# Altium footprint library Connector.PcbLib: 129 footprints (part 5 of 9)
Each footprint in its own frame and in the unit in brackets; x right, y up, seen from the top. Pads: shape width x height; smd on the part's side, far side on the other; paste and mask are expansions set on the pad; w line width, h text height; cw(c..) or ccw(c..) is an arc to the next point about the centre after c.
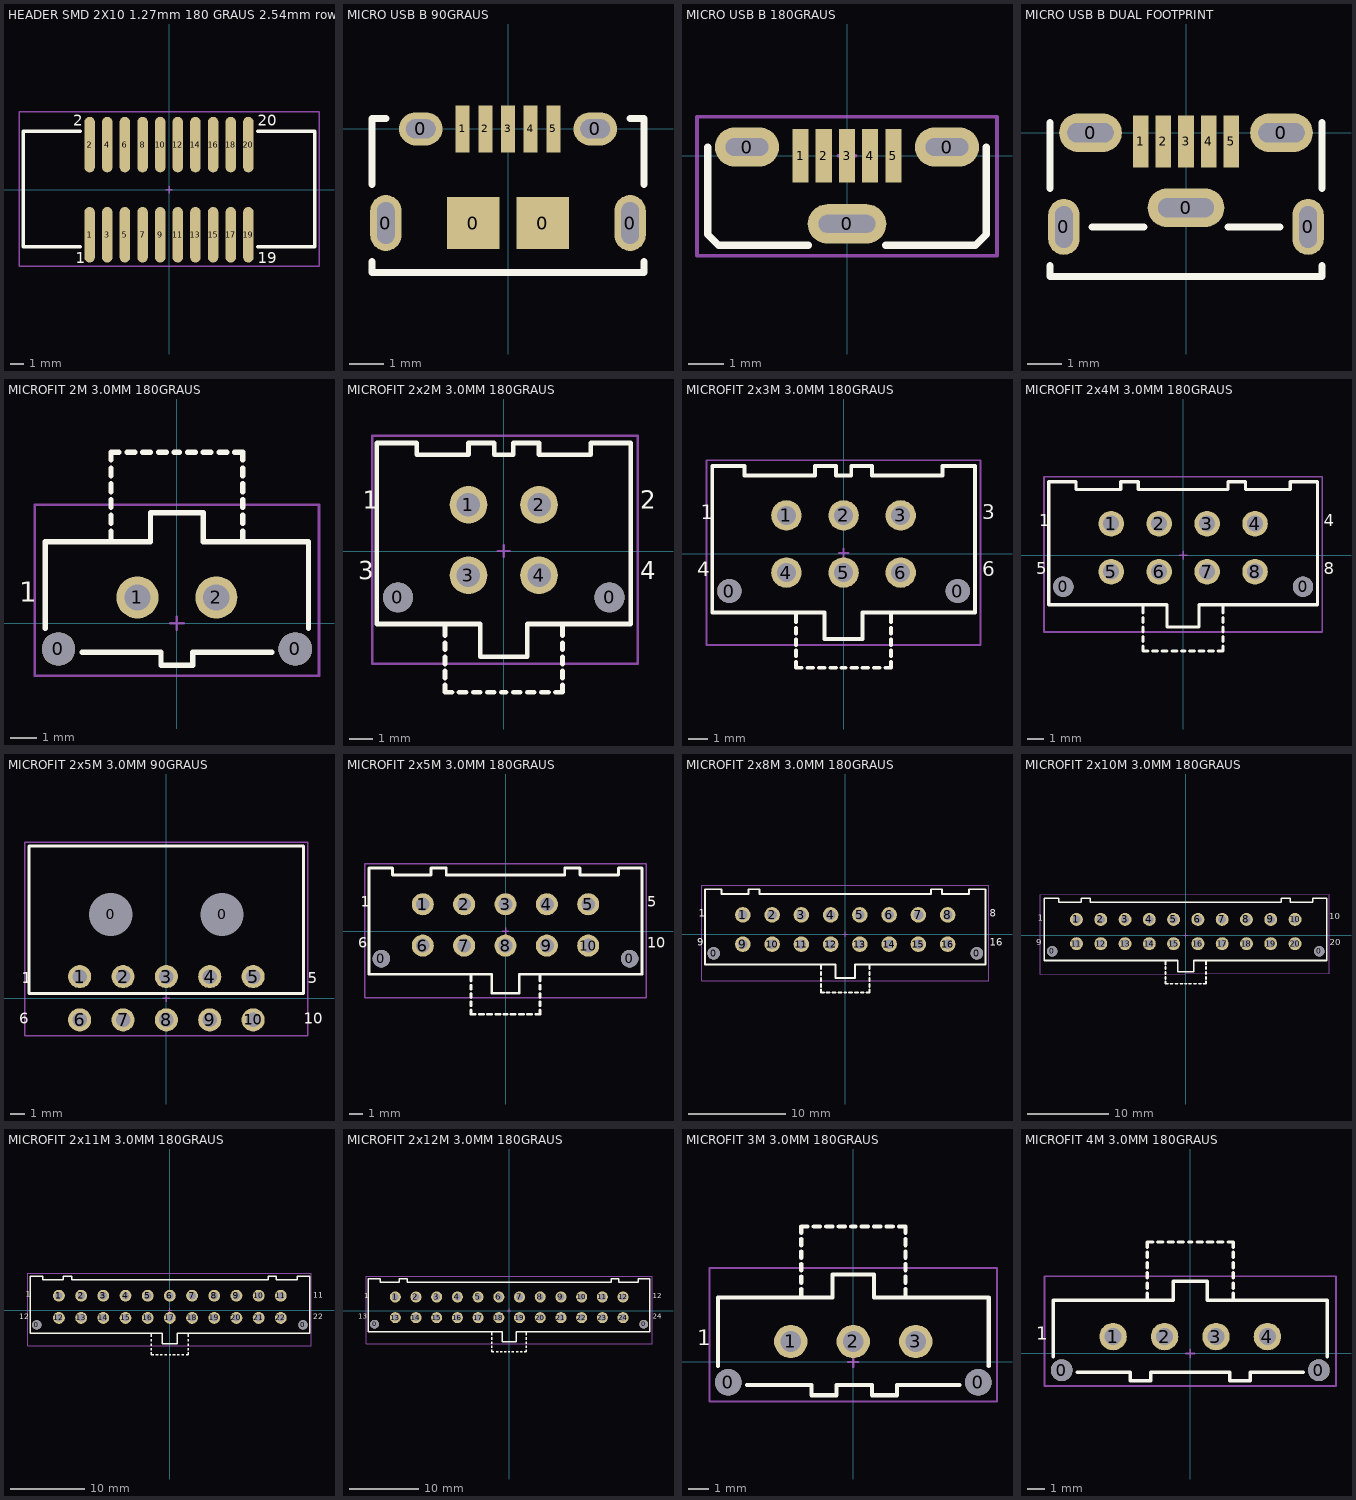
[diagram p4: the footprints below, top view; thin cyan lines are the x and y axes]

## HEADER SMD 2X10 1.27mm 180 GRAUS 2.54mm row spacing shrouded [mm]
height 6.5
pads (20):
  oval 0.76x4 smd: 1(-5.715,-3.25) 2(-5.715,3.25) 3(-4.445,-3.25) 4(-4.445,3.25) 5(-3.175,-3.25) 6(-3.175,3.25) 7(-1.905,-3.25) 8(-1.905,3.25) 9(-0.635,-3.25) 10(-0.635,3.25) 11(0.635,-3.25) 12(0.635,3.25) 13(1.905,-3.25) 14(1.905,3.25) 15(3.175,-3.25) 16(3.175,3.25) 17(4.445,-3.25) 18(4.445,3.25) 19(5.715,-3.25) 20(5.715,3.25)
Top Overlay:
  lines w0.254: -6.4,-4.1 -10.5,-4.1 -10.5,4.2 -6.4,4.2 ; 6.4,-4.1 10.5,-4.1 10.5,4.2 6.4,4.2
  text "20" at 6.4,4.6 h0.8
  text "19" at 6.4,-5.3 h0.8
  text "2" at -6.9,4.6 h0.8
  text "1" at -6.7,-5.3 h0.8
Mechanical 15:
  lines w0.1: -0.25,0 0.25,0 ; 0,-0.25 0,0.25 ; -10.8,-5.5 -10.8,5.6 10.8,5.6 10.8,-5.5 -10.8,-5.5
3D body "SBH41-_ _ _B-D10-SM-_ _.STEP": height 6.49, standoff -0.81, extent -10.365,-4.2 10.365,4.3

## MICRO USB B 90GRAUS [mm]
pads (11):
  oval 0.9x1.6 hole 0.5 slot 1.2 at 90 deg: 0(-3.5,-2.7) 0(3.5,-2.7)
  oval 1.25x0.95 hole 0.55 slot 0.85 at 0 deg: 0(-2.5,0) 0(2.5,0)
  rect 1.5x1.5 smd: 0(-1,-2.7) 0(1,-2.7)
  rect 0.4x1.35 smd: 1(-1.3,0) 2(-0.65,0) 3(0,0) 4(0.65,0) 5(1.3,0)
Top Overlay:
  lines w0.2: -3.9,-3.8 -3.9,-4.125 3.9,-4.125 3.9,-3.8 ; -3.9,-1.6 -3.9,0.3 -3.5,0.3 ; 3.5,0.3 3.9,0.3 3.9,-1.6
3D body "User Library-10118194.STEP": height 2.73, standoff -0.55, extent -4.025,-5.38 4.025,0.2

## MICRO USB B 180GRAUS [mm]
height 6.7
pads (8):
  oval 1.8x1.1 hole 0.5 slot 1.2 at 0 deg: 0(-2.8,0.25) 0(2.8,0.25)
  oval 2.2x1.1 hole 0.5 slot 1.6 at 0 deg: 0(0,-1.9)
  rect 0.45x1.5 smd: 1(-1.3,0) 2(-0.65,0) 3(0,0) 4(0.65,0) 5(1.3,0)
Top Overlay:
  lines w0.2: -3.9,0.25 -3.9,-2.2 -3.6,-2.5 -1.075,-2.5 ; 1.075,-2.5 3.6,-2.5 3.9,-2.2 3.9,0.25
Mechanical 15:
  lines w0.1: -0.25,0 0.25,0 ; 0,-0.25 0,0.25 ; -4.2,-2.8 -4.2,1.1 4.2,1.1 4.2,-2.8 -4.2,-2.8
3D body "Micro USB B 1051330011.STEP": height 6.65, standoff -2.36, extent -4.025,-2.41 3.975,0.605

## MICRO USB B DUAL FOOTPRINT [mm] "Micro USB 90 ou 180 graus"
pads (10):
  oval 0.9x1.6 hole 0.5 slot 1.2 at 90 deg: 0(-3.5,-2.7) 0(3.5,-2.7)
  oval 1.8x1.1 hole 0.55 slot 1.325 at 0 deg: 0(-2.738,0) 0(2.738,0)
  oval 2.2x1.1 hole 0.55 slot 1.6 at 0 deg: 0(0,-2.15)
  rect 0.45x1.5 smd: 1(-1.3,-0.25) 2(-0.65,-0.25) 3(0,-0.25) 4(0.65,-0.25) 5(1.3,-0.25)
Top Overlay:
  lines w0.2: -3.9,-3.8 -3.9,-4.125 3.9,-4.125 3.9,-3.8 ; -3.9,0 -3.9,-1.6 -3.9,0.3 ; -2.7,-2.7 -1.2,-2.7 ; 1.2,-2.7 2.7,-2.7 ; 3.9,0 3.9,-1.6 3.9,0.3
3D body "User Library-10118194.STEP": height 2.73, standoff -0.55, extent -4.025,-5.38 4.025,0.2
3D body "Micro USB B 1051330011.STEP": height 6.65, standoff -2.36, extent -4.025,-2.66 3.975,0.355

## MICROFIT 2M 3.0MM 180GRAUS [mm]
height 9.9
pads (4):
  round 1.27 hole 1.27 unplated: 0(-4.5,-0.98) 0(4.5,-0.98)
  round 1.6 hole 1: 1(-1.5,0.98) 2(1.5,0.98)
Top Overlay:
  lines w0.2: -5,-0.2 -5,3.1 -1,3.1 -1,4.2 1,4.2 1,3.1 5,3.1 5,-0.2 ; -3.6,-1.1 -0.6,-1.1 -0.6,-1.6 0.6,-1.6 0.6,-1.1 3.6,-1.1 ; -2.5,3.2 -2.5,3.5 ; -2.5,3.8 -2.5,4.1 ; -2.5,4.4 -2.5,4.7 ; -2.5,5 -2.5,5.3 ; -2.5,5.6 -2.5,5.9 ; -2.5,6.2 -2.5,6.5 -2.2,6.5 ; -1.9,6.5 -1.6,6.5 ; -1.3,6.5 -1,6.5 ; -0.7,6.5 -0.4,6.5 ; -0.1,6.5 0.1,6.5 ; 0.4,6.5 0.7,6.5 ; 1,6.5 1.3,6.5 ; 1.6,6.5 1.9,6.5 ; 2.2,6.5 2.5,6.5 2.5,6.2 ; 2.5,3.2 2.5,3.5 ; 2.5,3.8 2.5,4.1 ; 2.5,4.4 2.5,4.7 ; 2.5,5 2.5,5.3 ; 2.5,5.6 2.5,5.9
  text "1" at -6,0.81 h0.76
Mechanical 15:
  lines w0.1: -0.25,0 0.25,0 ; 0,-0.25 0,0.25 ; -5.4,-2 -5.4,4.5 5.4,4.5 5.4,-2 -5.4,-2
3D body "STEP-662002013322-rev1.stp": height 17.6, standoff 3.6, extent -4.14,-1.7 4.14,6.38
3D body "Microfit 2 vias.STEP": height 9.95, standoff -3.13, extent -4.825,-1.495 4.825,4.075

## MICROFIT 2x2M 3.0MM 180GRAUS [mm]
height 9.9
pads (6):
  round 1.27 hole 1.27 unplated: 0(-4.5,-1.97) 0(4.5,-1.97)
  round 1.6 hole 1: 1(-1.5,1.97) 2(1.5,1.97) 3(-1.5,-1.03) 4(1.5,-1.03)
Top Overlay:
  lines w0.2: -2.5,-5.7 -2.5,-6 -2.2,-6 ; -2.5,-5.4 -2.5,-5.1 ; -2.5,-4.8 -2.5,-4.5 ; -2.5,-4.2 -2.5,-3.9 ; -2.5,-3.6 -2.5,-3.1 ; -1.9,-6 -1.6,-6 ; -1.3,-6 -1,-6 ; -0.7,-6 -0.4,-6 ; -0.1,-6 0.1,-6 ; 0.4,-6 0.7,-6 ; 1,-6 1.3,-6 ; 1.6,-6 1.9,-6 ; 2.2,-6 2.5,-6 2.5,-5.7 ; 2.5,-5.4 2.5,-5.1 ; 2.5,-4.8 2.5,-4.5 ; 2.5,-4.2 2.5,-3.9 ; 2.5,-3.6 2.5,-3.1 ; -5.4,-3.1 -5.4,4.6 -3.7,4.6 -3.7,4.1 -1.5,4.1 -1.5,4.6 -0.8,4.6 -0.4,4.6 -0.4,4.1 0.4,4.1 0.4,4.6 0.8,4.6 1.5,4.6 1.5,4.1 3.7,4.1 3.7,4.6 5.4,4.6 5.4,-3.1 1,-3.1 1,-4.49 -1,-4.49 -1,-3.1 -5.4,-3.1
  text "1" at -6,1.8 h0.76
  text "2" at 5.8,1.8 h0.76
  text "3" at -6.2,-1.2 h0.76
  text "4" at 5.8,-1.2 h0.76
Mechanical 15:
  lines w0.1: -0.25,0 0.25,0 ; 0,-0.25 0,0.25 ; -5.6,-4.8 5.7,-4.8 5.7,4.9 -5.6,4.9 -5.6,-4.8
3D body "STEP-662004113322-rev1.stp": height 17.7, standoff 3.7, extent -3.425,-5.9 3.425,4.7
3D body "430450427.STEP": height 9.95, standoff -3.14, extent -5.075,-4.3 5.075,4.47

## MICROFIT 2x3M 3.0MM 180GRAUS [mm]
height 9.9
pads (8):
  round 1.27 hole 1.27 unplated: 0(-6,-1.97) 0(6,-1.97)
  round 1.6 hole 1: 1(-3,2) 2(0,2) 3(3,2) 4(-3,-1) 5(0,-1) 6(3,-1)
Top Overlay:
  lines w0.2: -2.5,-5.7 -2.5,-6 -2.2,-6 ; -2.5,-5.4 -2.5,-5.1 ; -2.5,-4.8 -2.5,-4.5 ; -2.5,-4.2 -2.5,-3.9 ; -2.5,-3.6 -2.5,-3.1 ; -1.9,-6 -1.6,-6 ; -1.3,-6 -1,-6 ; -0.7,-6 -0.4,-6 ; -0.1,-6 0.1,-6 ; 0.4,-6 0.7,-6 ; 1,-6 1.3,-6 ; 1.6,-6 1.9,-6 ; 2.2,-6 2.5,-6 2.5,-5.7 ; 2.5,-5.4 2.5,-5.1 ; 2.5,-4.8 2.5,-4.5 ; 2.5,-4.2 2.5,-3.9 ; 2.5,-3.6 2.5,-3.1 ; -6.9,-3.1 -6.9,4.6 -5.2,4.6 -5.2,4.1 -1.5,4.1 -1.5,4.6 -0.8,4.6 -0.4,4.6 -0.4,4.1 0.4,4.1 0.4,4.6 0.8,4.6 1.5,4.6 1.5,4.1 5.2,4.1 5.2,4.6 6.9,4.6 6.9,-3.1 1,-3.1 1,-4.49 -1,-4.49 -1,-3.1 -6.9,-3.1
  text "4" at -7.7,-1.2 h0.76
  text "1" at -7.5,1.8 h0.76
  text "3" at 7.3,1.8 h0.76
  text "6" at 7.3,-1.2 h0.76
Mechanical 15:
  lines w0.1: -0.25,0.03 0.25,0.03 ; 0,-0.22 0,0.28 ; -7.2,-4.8 -7.2,4.9 7.2,4.9 7.2,-4.8 -7.2,-4.8
3D body "STEP-662006113322-rev1.stp": height 17.7, standoff 3.7, extent -4.925,-5.9 4.925,4.7
3D body "430450627.STEP": height 9.95, standoff -3.14, extent -6.575,-4.3 6.575,4.47

## MICROFIT 2x4M 3.0MM 180GRAUS [mm]
height 9.9
pads (10):
  round 1.27 hole 1.27 unplated: 0(-7.5,-1.97) 0(7.5,-1.97)
  round 1.6 hole 1: 1(-4.5,1.97) 2(-1.5,1.97) 3(1.5,1.97) 4(4.5,1.97) 5(-4.5,-1.03) 6(-1.5,-1.03) 7(1.5,-1.03) 8(4.5,-1.03)
Top Overlay:
  lines w0.2: -2.5,-5.7 -2.5,-6 -2.2,-6 ; -2.5,-5.4 -2.5,-5.1 ; -2.5,-4.8 -2.5,-4.5 ; -2.5,-4.2 -2.5,-3.9 ; -2.5,-3.6 -2.5,-3.1 ; -1.9,-6 -1.6,-6 ; -1.3,-6 -1,-6 ; -0.7,-6 -0.4,-6 ; -0.1,-6 0.1,-6 ; 0.4,-6 0.7,-6 ; 1,-6 1.3,-6 ; 1.6,-6 1.9,-6 ; 2.2,-6 2.5,-6 2.5,-5.7 ; 2.5,-5.4 2.5,-5.1 ; 2.5,-4.8 2.5,-4.5 ; 2.5,-4.2 2.5,-3.9 ; 2.5,-3.6 2.5,-3.1 ; -8.4,-3.1 -1,-3.1 -1,-4.49 1,-4.49 1,-3.1 8.4,-3.1 8.4,4.6 6.7,4.6 6.7,4.1 3.9,4.1 3.9,4.6 3.2,4.6 2.8,4.6 2.8,4.1 -2.8,4.1 -2.8,4.6 -3.2,4.6 -3.9,4.6 -3.9,4.1 -6.7,4.1 -6.7,4.6 -8.4,4.6 -8.4,-3.1
  text "5" at -9.2,-1.2 h0.76
  text "1" at -9,1.8 h0.76
  text "4" at 8.8,1.8 h0.76
  text "8" at 8.8,-1.2 h0.76
Mechanical 15:
  lines w0.1: -0.25,0 0.25,0 ; 0,-0.25 0,0.25 ; -8.7,-4.8 -8.7,4.9 8.7,4.9 8.7,-4.8 -8.7,-4.8
3D body "430450827.STEP": height 9.95, standoff -3.14, extent -8.075,-4.3 8.075,4.47
3D body "STEP-662008113322-rev1.stp": height 17.7, standoff 3.7, extent -6.425,-5.9 6.425,4.7

## MICROFIT 2x5M 3.0MM 90GRAUS [mm]
height 9.9
pads (12):
  round 1.27 hole 3 unplated: 0(-3.85,5.8) 0(3.85,5.8)
  round 1.6 hole 1: 1(-6,1.5) 2(-3,1.5) 3(0,1.5) 4(3,1.5) 5(6,1.5) 6(-6,-1.5) 7(-3,-1.5) 8(0,-1.5) 9(3,-1.5) 10(6,-1.5)
Top Overlay:
  lines w0.2: -9.5,0.33 -9.5,10.53 -4.2,10.53 9.5,10.53 9.5,0.33 -9.5,0.33
  text "10" at 9.5,-1.77 h0.76
  text "5" at 9.8,1.03 h0.76
  text "1" at -10,1.03 h0.76
  text "6" at -10.2,-1.77 h0.76
Mechanical 15:
  lines w0.1: -0.25,0 0.25,0 ; 0,-0.25 0,0.25 ; -9.8,-2.6 9.8,-2.6 9.8,10.8 -9.8,10.8 -9.8,-2.6
3D body "662010113322 (rev1).stp": height 10.4, standoff -0.2, extent -7.925,4.1 7.925,18.1
3D body "66201021022 (rev1).stp": height 8.83, standoff -3.13, extent -9.35,-1.84 9.35,10.38

## MICROFIT 2x5M 3.0MM 180GRAUS [mm]
height 9.9
pads (12):
  round 1.27 hole 1.27 unplated: 0(-9,-1.97) 0(9,-1.97)
  round 1.6 hole 1: 1(-6,1.97) 2(-3,1.97) 3(0,1.97) 4(3,1.97) 5(6,1.97) 6(-6,-1.03) 7(-3,-1.03) 8(0,-1.03) 9(3,-1.03) 10(6,-1.03)
Top Overlay:
  lines w0.2: -2.5,-5.7 -2.5,-6 -2.2,-6 ; -2.5,-5.4 -2.5,-5.1 ; -2.5,-4.8 -2.5,-4.5 ; -2.5,-4.2 -2.5,-3.9 ; -2.5,-3.6 -2.5,-3.1 ; -1.9,-6 -1.6,-6 ; -1.3,-6 -1,-6 ; -0.7,-6 -0.4,-6 ; -0.1,-6 0.1,-6 ; 0.4,-6 0.7,-6 ; 1,-6 1.3,-6 ; 1.6,-6 1.9,-6 ; 2.2,-6 2.5,-6 2.5,-5.7 ; 2.5,-5.4 2.5,-5.1 ; 2.5,-4.8 2.5,-4.5 ; 2.5,-4.2 2.5,-3.9 ; 2.5,-3.6 2.5,-3.1 ; -9.9,-3.1 -1,-3.1 -1,-4.49 1,-4.49 1,-3.1 9.9,-3.1 9.9,4.6 8.2,4.6 8.2,4.1 5.4,4.1 5.4,4.6 4.7,4.6 4.3,4.6 4.3,4.1 -4.3,4.1 -4.3,4.6 -4.7,4.6 -5.4,4.6 -5.4,4.1 -8.2,4.1 -8.2,4.6 -9.9,4.6 -9.9,-3.1
  text "10" at 10.3,-1.2 h0.76
  text "5" at 10.3,1.8 h0.76
  text "1" at -10.5,1.8 h0.76
  text "6" at -10.7,-1.2 h0.76
Mechanical 15:
  lines w0.1: -0.25,0 0.25,0 ; 0,-0.25 0,0.25 ; -10.2,-4.8 10.2,-4.8 10.2,4.9 -10.2,4.9 -10.2,-4.8
3D body "430451027.STEP": height 9.95, standoff -3.14, extent -9.575,-4.3 9.575,4.47
3D body "STEP-662010113322-rev1.stp": height 17.7, standoff 3.7, extent -7.925,-5.9 7.925,4.7

## MICROFIT 2x8M 3.0MM 180GRAUS [mm]
height 9.9
pads (18):
  round 1.27 hole 1.27 unplated: 0(-13.5,-1.97) 0(13.5,-1.97)
  round 1.6 hole 1: 1(-10.5,1.97) 2(-7.5,1.97) 3(-4.5,1.97) 4(-1.5,1.97) 5(1.5,1.97) 6(4.5,1.97) 7(7.5,1.97) 8(10.5,1.97) 9(-10.5,-1.03) 10(-7.5,-1.03) 11(-4.5,-1.03) 12(-1.5,-1.03) 13(1.5,-1.03) 14(4.5,-1.03) 15(7.5,-1.03) 16(10.5,-1.03)
Top Overlay:
  lines w0.2: -2.5,-5.7 -2.5,-6 -2.2,-6 ; -2.5,-5.4 -2.5,-5.1 ; -2.5,-4.8 -2.5,-4.5 ; -2.5,-4.2 -2.5,-3.9 ; -2.5,-3.6 -2.5,-3.1 ; -1.9,-6 -1.6,-6 ; -1.3,-6 -1,-6 ; -0.7,-6 -0.4,-6 ; -0.1,-6 0.1,-6 ; 0.4,-6 0.7,-6 ; 1,-6 1.3,-6 ; 1.6,-6 1.9,-6 ; 2.2,-6 2.5,-6 2.5,-5.7 ; 2.5,-5.4 2.5,-5.1 ; 2.5,-4.8 2.5,-4.5 ; 2.5,-4.2 2.5,-3.9 ; 2.5,-3.6 2.5,-3.1 ; -14.4,-3.1 -14.4,4.6 -12.7,4.6 -12.7,4.1 -9.9,4.1 -9.9,4.6 -9.2,4.6 -8.8,4.6 -8.8,4.1 8.8,4.1 8.8,4.6 9.2,4.6 9.9,4.6 9.9,4.1 12.7,4.1 12.7,4.6 14.4,4.6 14.4,-3.1 1,-3.1 1,-4.49 -1,-4.49 -1,-3.1 -14.4,-3.1
  text "16" at 14.8,-1.2 h0.76
  text "8" at 14.8,1.8 h0.76
  text "1" at -15,1.8 h0.76
  text "9" at -15.2,-1.2 h0.76
Mechanical 15:
  lines w0.1: -0.25,0 0.25,0 ; 0,-0.25 0,0.25 ; -14.7,-4.8 14.7,-4.8 14.7,5 -14.7,5 -14.7,-4.8
3D body "STEP-662016113322-rev1.stp": height 17.7, standoff 3.7, extent -12.425,-5.9 12.425,4.7
3D body "430451627.STEP": height 9.95, standoff -3.14, extent -14.075,-4.3 14.075,4.47

## MICROFIT 2x10M 3.0MM 180GRAUS [mm]
height 9.9
pads (22):
  round 1.27 hole 1.27 unplated: 0(-16.5,-1.97) 0(16.5,-1.97)
  round 1.6 hole 1: 1(-13.5,1.97) 2(-10.5,1.97) 3(-7.5,1.97) 4(-4.5,1.97) 5(-1.5,1.97) 6(1.5,1.97) 7(4.5,1.97) 8(7.5,1.97) 9(10.5,1.97) 10(13.5,1.97) 11(-13.5,-1.03) 12(-10.5,-1.03) 13(-7.5,-1.03) 14(-4.5,-1.03) 15(-1.5,-1.03) 16(1.5,-1.03) 17(4.5,-1.03) 18(7.5,-1.03) 19(10.5,-1.03) 20(13.5,-1.03)
Top Overlay:
  lines w0.2: -9.9,4.1 -9.2,4.1 -8.8,4.1 8.8,4.1 8.2,4.1 11.8,4.1 11.8,4.6 12.2,4.6 12.9,4.6 12.9,4.1 15.7,4.1 15.7,4.6 17.4,4.6 17.4,-3.1 13.8,-3.1 ; -8.9,4.1 -11.8,4.1 -11.8,4.6 -12.2,4.6 -12.9,4.6 -12.9,4.1 -15.7,4.1 -15.7,4.6 -17.5,4.6 -17.5,-3.1 -14.5,-3.1 -1,-3.1 -1,-4.49 1,-4.49 1,-3.1 14.4,-3.1 ; -2.5,-5.7 -2.5,-6 -2.2,-6 ; -2.5,-5.4 -2.5,-5.1 ; -2.5,-4.8 -2.5,-4.5 ; -2.5,-4.2 -2.5,-3.9 ; -2.5,-3.6 -2.5,-3.1 ; -1.9,-6 -1.6,-6 ; -1.3,-6 -1,-6 ; -0.7,-6 -0.4,-6 ; -0.1,-6 0.1,-6 ; 0.4,-6 0.7,-6 ; 1,-6 1.3,-6 ; 1.6,-6 1.9,-6 ; 2.2,-6 2.5,-6 2.5,-5.7 ; 2.5,-5.4 2.5,-5.1 ; 2.5,-4.8 2.5,-4.5 ; 2.5,-4.2 2.5,-3.9 ; 2.5,-3.6 2.5,-3.1
  text "9" at -18.5,-1.2 h0.76
  text "1" at -18.3,1.8 h0.76
  text "10" at 17.7,2 h0.76
  text "20" at 17.8,-1.2 h0.76
Mechanical 15:
  lines w0.1: -0.25,0 0.25,0 ; 0,-0.25 0,0.25 ; 17.7,5 17.7,-4.7 -18,-4.8 -18,5 17.7,5.1
3D body "430252000.STEP": height 17.9, standoff 3.9, extent -15.4,-6.3 15.45,4.55
3D body "430452028.STEP": height 9.95, standoff -3.14, extent -17.075,-4.3 17.075,4.47

## MICROFIT 2x11M 3.0MM 180GRAUS [mm]
height 9.9
pads (24):
  round 1.27 hole 1.27 unplated: 0(-18,-1.97) 0(18,-1.97)
  round 1.6 hole 1: 1(-15,1.97) 2(-12,1.97) 3(-9,1.97) 4(-6,1.97) 5(-3,1.97) 6(0,1.97) 7(3,1.97) 8(6,1.97) 9(9,1.97) 10(12,1.97) 11(15,1.97) 12(-15,-1.03) 13(-12,-1.03) 14(-9,-1.03) 15(-6,-1.03) 16(-3,-1.03) 17(0,-1.03) 18(3,-1.03) 19(6,-1.03) 20(9,-1.03) 21(12,-1.03) 22(15,-1.03)
Top Overlay:
  lines w0.2: -2.5,-5.7 -2.5,-6 -2.2,-6 ; -2.5,-5.4 -2.5,-5.1 ; -2.5,-4.8 -2.5,-4.5 ; -2.5,-4.2 -2.5,-3.9 ; -2.5,-3.6 -2.5,-3.1 ; -1.9,-6 -1.6,-6 ; -1.3,-6 -1,-6 ; -0.7,-6 -0.4,-6 ; -0.1,-6 0.1,-6 ; 0.4,-6 0.7,-6 ; 1,-6 1.3,-6 ; 1,-3.6 1,-3.1 ; 1.6,-6 1.9,-6 ; 2.2,-6 2.5,-6 2.5,-5.7 ; 2.5,-5.4 2.5,-5.1 ; 2.5,-4.8 2.5,-4.5 ; 2.5,-4.2 2.5,-3.9 ; 2.5,-3.6 2.5,-3.1 ; 13.4,4.6 13.3,4.6 ; -18.9,4.6 -17.2,4.6 ; -18.9,4.6 -18.9,-3.1 -1,-3.1 -1,-4.49 1,-4.49 1,-3.1 ; -18.9,4.6 -17.2,4.6 ; -17.2,4.1 -17.2,4.6 ; -17.2,4.1 -14.4,4.1 ; -17.2,4.1 -17.2,4.6 ; -17.2,4.1 -14.4,4.1 ; -14.4,4.1 -14.4,4.6 ; -14.4,4.1 -14.4,4.6 ; -14.4,4.6 -13.7,4.6 -13.3,4.6 ; -14.4,4.6 -13.3,4.6 ; -13.3,4.1 -13.3,4.6 ; -13.3,4.1 13.3,4.1 ; -13.3,4.1 -13.3,4.6 ; 1,-3.1 18.9,-3.1 18.9,4.6 ; 13.3,4.1 13.3,4.6 ; 13.3,4.1 13.3,4.6 ; 13.3,4.6 13.7,4.6 14.4,4.6 ; 14.4,4.1 14.4,4.6 ; 14.4,4.1 17.2,4.1 ; 14.4,4.1 17.2,4.1 ; 14.4,4.1 14.4,4.6 ; 17.2,4.1 17.2,4.6 ; 17.2,4.1 17.2,4.6 ; 17.2,4.6 18.9,4.6 ; 17.2,4.6 18.9,4.6
  text "22" at 19.4,-1.2 h0.76
  text "11" at 19.4,1.7 h0.76
  text "1" at -19.5,1.8 h0.76
  text "12" at -20.4,-1.2 h0.76
Mechanical 15:
  lines w0.1: -0.25,0 0.25,0 ; 0,-0.25 0,0.25 ; -19.2,-4.8 -19.2,5 19.1,5 19.1,-4.8 -19.2,-4.8
3D body "430252210.STEP": height 17.9, standoff 3.9, extent -17,-6.3 16.85,4.55
3D body "430452228.STEP": height 9.95, standoff -3.14, extent -18.575,-4.26 18.575,4.51

## MICROFIT 2x12M 3.0MM 180GRAUS [mm]
height 9.9
pads (26):
  round 1.27 hole 1.27 unplated: 0(-19.5,-1.97) 0(19.5,-1.97)
  round 1.6 hole 1: 1(-16.5,1.97) 2(-13.5,1.97) 3(-10.5,1.97) 4(-7.5,1.97) 5(-4.5,1.97) 6(-1.5,1.97) 7(1.5,1.97) 8(4.5,1.97) 9(7.5,1.97) 10(10.5,1.97) 11(13.5,1.97) 12(16.5,1.97) 13(-16.5,-1.03) 14(-13.5,-1.03) 15(-10.5,-1.03) 16(-7.5,-1.03) 17(-4.5,-1.03) 18(-1.5,-1.03) 19(1.5,-1.03) 20(4.5,-1.03) 21(7.5,-1.03) 22(10.5,-1.03) 23(13.5,-1.03) 24(16.5,-1.03)
Top Overlay:
  lines w0.2: -2.5,-5.7 -2.5,-6 -2.2,-6 ; -2.5,-5.4 -2.5,-5.1 ; -2.5,-4.8 -2.5,-4.5 ; -2.5,-4.2 -2.5,-3.9 ; -2.5,-3.6 -2.5,-3.1 ; -1.9,-6 -1.6,-6 ; -1.3,-6 -1,-6 ; -0.7,-6 -0.4,-6 ; -0.1,-6 0.1,-6 ; 0.4,-6 0.7,-6 ; 1,-6 1.3,-6 ; 1.6,-6 1.9,-6 ; 2.2,-6 2.5,-6 2.5,-5.7 ; 2.5,-5.4 2.5,-5.1 ; 2.5,-4.8 2.5,-4.5 ; 2.5,-4.2 2.5,-3.9 ; 2.5,-3.6 2.5,-3.1 ; 14.9,4.6 14.8,4.6 ; -20.4,4.6 -18.7,4.6 ; -20.4,4.6 -20.4,-3.1 -1,-3.1 -1,-4.49 1,-4.49 1,-3.1 20.4,-3.1 ; -20.4,4.6 -18.7,4.6 ; -18.7,4.1 -18.7,4.6 ; -18.7,4.1 -15.9,4.1 ; -18.7,4.1 -18.7,4.6 ; -18.7,4.1 -15.9,4.1 ; -15.9,4.1 -15.9,4.6 ; -15.9,4.1 -15.9,4.6 ; -15.9,4.6 -15.2,4.6 -14.8,4.6 ; -15.9,4.6 -14.8,4.6 ; -14.8,4.1 -14.8,4.6 ; -14.8,4.1 14.8,4.1 ; -14.8,4.1 -14.8,4.6 ; 14.8,4.1 14.8,4.6 ; 14.8,4.1 14.8,4.6 ; 14.8,4.6 15.2,4.6 15.9,4.6 ; 15.9,4.1 15.9,4.6 ; 15.9,4.1 18.7,4.1 ; 15.9,4.1 18.7,4.1 ; 15.9,4.1 15.9,4.6 ; 18.7,4.1 18.7,4.6 ; 18.7,4.1 18.7,4.6 ; 18.7,4.6 20.4,4.6 ; 18.7,4.6 20.4,4.6 ; 20.4,-3.1 20.4,4.6 ; 20.4,-3.1 20.4,4.6
  text "24" at 20.8,-1.2 h0.76
  text "12" at 20.8,1.8 h0.76
  text "1" at -21,1.8 h0.76
  text "13" at -21.9,-1.2 h0.76
Mechanical 15:
  lines w0.1: -0.25,0 0.25,0 ; 0,-0.25 0,0.25 ; -20.7,-4.8 -20.7,5 20.7,5 20.7,-4.8 -20.7,-4.8
3D body "430252410.STEP": height 17.9, standoff 3.9, extent -18.4,-6.3 18.45,4.55
3D body "430452428.STEP": height 9.95, standoff -3.14, extent -20.075,-4.3 20.075,4.47

## MICROFIT 3M 3.0MM 180GRAUS [mm]
height 9.9
pads (5):
  round 1.27 hole 1.27 unplated: 0(-6,-0.98) 0(6,-0.98)
  round 1.6 hole 1: 1(-3,0.98) 2(0,0.98) 3(3,0.98)
Top Overlay:
  lines w0.2: -6.5,-0.2 -6.5,3.1 -1,3.1 -1,4.2 1,4.2 1,3.1 6.5,3.1 6.5,-0.2 ; -5.1,-1.1 -2,-1.1 -2,-1.6 -0.8,-1.6 -0.8,-1.1 0.9,-1.1 0.9,-1.6 2.1,-1.6 2.1,-1.1 5.1,-1.1 ; -2.5,3.2 -2.5,3.5 ; -2.5,3.8 -2.5,4.1 ; -2.5,4.4 -2.5,4.7 ; -2.5,5 -2.5,5.3 ; -2.5,5.6 -2.5,5.9 ; -2.5,6.2 -2.5,6.5 -2.2,6.5 ; -1.9,6.5 -1.6,6.5 ; -1.3,6.5 -1,6.5 ; -0.7,6.5 -0.4,6.5 ; -0.1,6.5 0.1,6.5 ; 0.4,6.5 0.7,6.5 ; 1,6.5 1.3,6.5 ; 1.6,6.5 1.9,6.5 ; 2.2,6.5 2.5,6.5 2.5,6.2 ; 2.5,3.2 2.5,3.5 ; 2.5,3.8 2.5,4.1 ; 2.5,4.4 2.5,4.7 ; 2.5,5 2.5,5.3 ; 2.5,5.6 2.5,5.9
  text "1" at -7.5,0.81 h0.76
Mechanical 15:
  lines w0.1: -0.25,0 0.25,0 ; 0,-0.25 0,0.25 ; -6.9,-1.9 -6.9,4.5 6.9,4.5 6.9,-1.9 -6.9,-1.9
3D body "STEP-662003013322-rev1.stp": height 17.6, standoff 3.6, extent -4.925,-1.68 4.925,6.4
3D body "Microfit 3 vias.STEP": height 9.95, standoff -3.13, extent -6.325,-1.49 6.325,4.08

## MICROFIT 4M 3.0MM 180GRAUS [mm]
height 9.9
pads (6):
  round 1.27 hole 1.27 unplated: 0(-7.5,-0.98) 0(7.5,-0.98)
  round 1.6 hole 1: 1(-4.5,0.98) 2(-1.5,0.98) 3(1.5,0.98) 4(4.5,0.98)
Top Overlay:
  lines w0.2: -8,-0.2 -8,3.1 -1,3.1 -1,4.2 1,4.2 1,3.1 5,3.1 ; -6.6,-1.1 -3.5,-1.1 -3.5,-1.6 -2.3,-1.6 -2.3,-1.1 -0.6,-1.1 2.3,-1.1 2.3,-1.6 3.5,-1.6 3.5,-1.1 6.6,-1.1 ; -2.5,3.2 -2.5,3.5 ; -2.5,3.8 -2.5,4.1 ; -2.5,4.4 -2.5,4.7 ; -2.5,5 -2.5,5.3 ; -2.5,5.6 -2.5,5.9 ; -2.5,6.2 -2.5,6.5 -2.2,6.5 ; -1.9,6.5 -1.6,6.5 ; -1.3,6.5 -1,6.5 ; -0.7,6.5 -0.4,6.5 ; -0.1,6.5 0.1,6.5 ; 0.4,6.5 0.7,6.5 ; 1,6.5 1.3,6.5 ; 1.6,6.5 1.9,6.5 ; 2.2,6.5 2.5,6.5 2.5,6.2 ; 2.5,3.1 8,3.1 8,-0.2 ; 2.5,3.2 2.5,3.5 ; 2.5,3.8 2.5,4.1 ; 2.5,4.4 2.5,4.7 ; 2.5,5 2.5,5.3 ; 2.5,5.6 2.5,5.9
  text "1" at -9,0.81 h0.76
Mechanical 15:
  lines w0.1: -0.25,0 0.25,0 ; 0,-0.25 0,0.25 ; -8.5,-1.9 -8.5,4.5 8.5,4.5 8.5,-1.9 -8.5,-1.9
3D body "STEP-662004013322-rev1.stp": height 17.6, standoff 3.6, extent -6.425,-1.68 6.425,6.4
3D body "436500427.STEP": height 9.95, standoff -3.13, extent -7.825,-1.47 7.825,4.135